# Altium footprint library ALL.PcbLib: 153 footprints (part 3 of 11)
Each footprint in its own frame and in the unit in brackets; x right, y up, seen from the top. Pads: shape width x height; smd on the part's side, far side on the other; paste and mask are expansions set on the pad; w line width, h text height; cw(c..) or ccw(c..) is an arc to the next point about the centre after c.
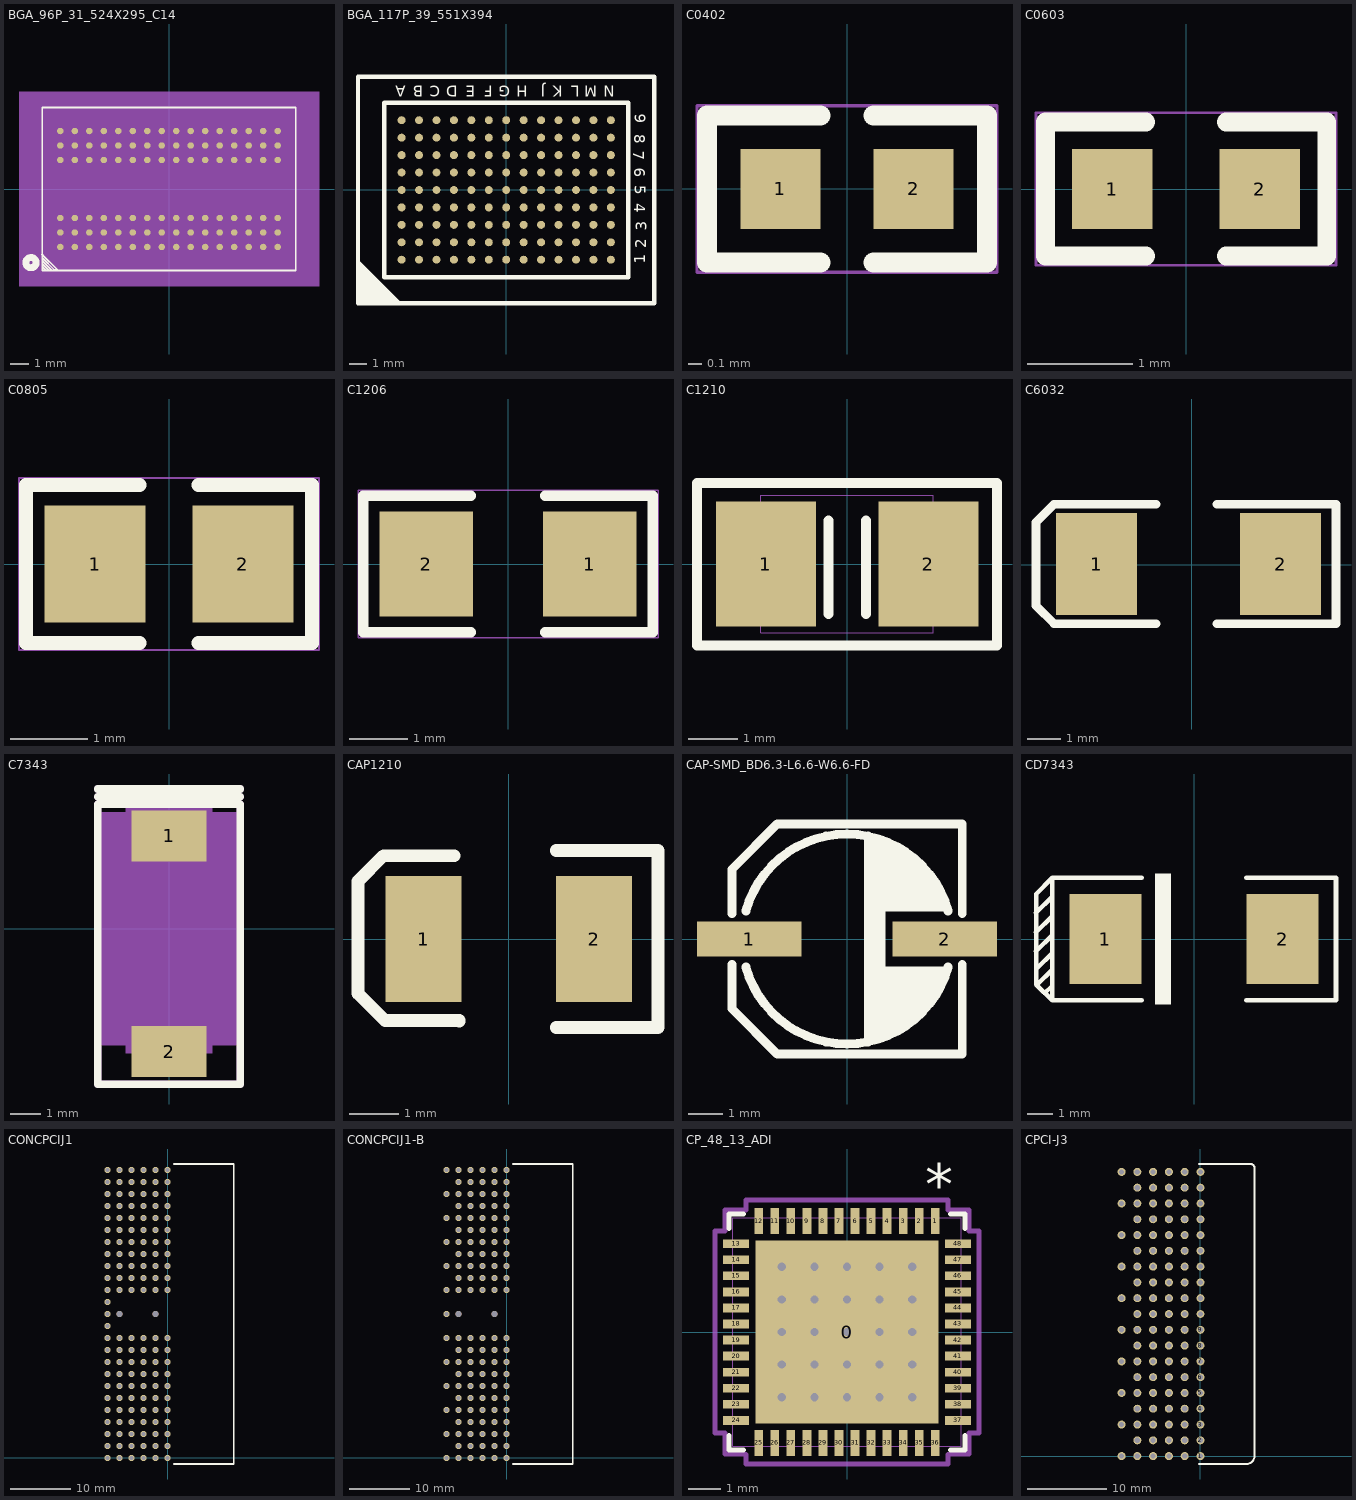
[diagram p2: the footprints below, top view; thin cyan lines are the x and y axes]

## BGA_96P_31_524X295_C14 [mil] "BGA_96P_31_524X295_C14"
pads (96):
  round 14 smd: A1(-236.22,-125.98) A2(-236.22,-94.49) A3(-236.22,-62.99) A7(-236.22,62.99) A8(-236.22,94.49) A9(-236.22,125.98) B1(-204.72,-125.98) B2(-204.72,-94.49) B3(-204.72,-62.99) B7(-204.72,62.99) B8(-204.72,94.49) B9(-204.72,125.98) C1(-173.23,-125.98) C2(-173.23,-94.49) C3(-173.23,-62.99) C7(-173.23,62.99) C8(-173.23,94.49) C9(-173.23,125.98) D1(-141.73,-125.98) D2(-141.73,-94.49) D3(-141.73,-62.99) D7(-141.73,62.99) D8(-141.73,94.49) D9(-141.73,125.98) E1(-110.24,-125.98) E2(-110.24,-94.49) E3(-110.24,-62.99) E7(-110.24,62.99) E8(-110.24,94.49) E9(-110.24,125.98) F1(-78.74,-125.98) F2(-78.74,-94.49) F3(-78.74,-62.99) F7(-78.74,62.99) F8(-78.74,94.49) F9(-78.74,125.98) G1(-47.24,-125.98) G2(-47.24,-94.49) G3(-47.24,-62.99) G7(-47.24,62.99) G8(-47.24,94.49) G9(-47.24,125.98) H1(-15.75,-125.98) H2(-15.75,-94.49) H3(-15.75,-62.99) H7(-15.75,62.99) H8(-15.75,94.49) H9(-15.75,125.98) J1(15.75,-125.98) J2(15.75,-94.49) J3(15.75,-62.99) J7(15.75,62.99) J8(15.75,94.49) J9(15.75,125.98) K1(47.24,-125.98) K2(47.24,-94.49) K3(47.24,-62.99) K7(47.24,62.99) K8(47.24,94.49) K9(47.24,125.98) L1(78.74,-125.98) L2(78.74,-94.49) L3(78.74,-62.99) L7(78.74,62.99) L8(78.74,94.49) L9(78.74,125.98) M1(110.24,-125.98) M2(110.24,-94.49) M3(110.24,-62.99) M7(110.24,62.99) M8(110.24,94.49) M9(110.24,125.98) N1(141.73,-125.98) N2(141.73,-94.49) N3(141.73,-62.99) N7(141.73,62.99) N8(141.73,94.49) N9(141.73,125.98) P1(173.23,-125.98) P2(173.23,-94.49) P3(173.23,-62.99) P7(173.23,62.99) P8(173.23,94.49) P9(173.23,125.98) R1(204.72,-125.98) R2(204.72,-94.49) R3(204.72,-62.99) R7(204.72,62.99) R8(204.72,94.49) R9(204.72,125.98) T1(236.22,-125.98) T2(236.22,-94.49) T3(236.22,-62.99) T7(236.22,62.99) T8(236.22,94.49) T9(236.22,125.98)
Top Overlay:
  circle w15: c-300,-160 r11.18
  lines w3.94: -275.98,-142.52 -275.2,-142.52 -241.73,-175.98 -248.82,-175.98 -275.2,-149.61 -275.2,-156.3 -255.12,-176.38 -261.42,-176.38 -274.41,-163.39 -274.41,-170.08 -268.11,-176.38 ; -275.59,-177.16 275.59,-177.16 275.59,177.16 -275.59,177.16 -275.59,-177.16
Mechanical 5:
  circle w15: c-300,-160 r11.18
  lines w3.94: -275.98,-142.52 -275.2,-142.52 -241.73,-175.98 -248.82,-175.98 -275.2,-149.61 -275.2,-156.3 -255.12,-176.38 -261.42,-176.38 -274.41,-163.39 -274.41,-170.08 -268.11,-176.38 ; -275.59,-177.16 275.59,-177.16 275.59,177.16 -275.59,177.16 -275.59,-177.16
  text "U4" at -362.51,27.5 h25
Mechanical 14:
  text "R1" at 204.72,-105.82 h25.2
  text "R9" at 204.72,146.14 h25.2
  text "F1" at -78.74,-105.82 h25.2
  text "D2" at -141.73,-74.33 h25.2
  text "A1" at -236.22,-105.82 h25.2
  text "B2" at -204.72,-74.33 h25.2
  text "C1" at -173.23,-105.82 h25.2
  text "H2" at -15.75,-74.33 h25.2
  text "K8" at 47.24,114.65 h25.2
  text "E9" at -110.24,146.14 h25.2
  text "D9" at -141.73,146.14 h25.2
  text "C9" at -173.23,146.14 h25.2
  text "A8" at -236.22,114.65 h25.2
  text "G7" at -47.24,83.15 h25.2
  text "H9" at -15.75,146.14 h25.2
  text "K2" at 47.24,-74.33 h25.2
  text "N1" at 141.73,-105.82 h25.2
  text "N9" at 141.73,146.14 h25.2
  text "H1" at -15.75,-105.82 h25.2
  text "M8" at 110.24,114.65 h25.2
  text "D3" at -141.73,-42.83 h25.2
  text "E7" at -110.24,83.15 h25.2
  text "M2" at 110.24,-74.33 h25.2
  text "K9" at 47.24,146.14 h25.2
  text "K3" at 47.24,-42.83 h25.2
  text "J7" at 15.75,83.15 h25.2
  text "K7" at 47.24,83.15 h25.2
  text "J3" at 15.75,-42.83 h25.2
  text "L3" at 78.74,-42.83 h25.2
  text "M3" at 110.24,-42.83 h25.2
  text "L2" at 78.74,-74.33 h25.2
  text "N8" at 141.73,114.65 h25.2
  text "L8" at 78.74,114.65 h25.2
  text "C7" at -173.23,83.15 h25.2
  text "G3" at -47.24,-42.83 h25.2
  text "K1" at 47.24,-105.82 h25.2
  text "T7" at 236.22,83.15 h25.2
  text "R2" at 204.72,-74.33 h25.2
  text "R7" at 204.72,83.15 h25.2
  text "L7" at 78.74,83.15 h25.2
  text "H8" at -15.75,114.65 h25.2
  text "B8" at -204.72,114.65 h25.2
  text "T2" at 236.22,-74.33 h25.2
  text "P3" at 173.23,-42.83 h25.2
  text "C8" at -173.23,114.65 h25.2
  text "F2" at -78.74,-74.33 h25.2
  text "N3" at 141.73,-42.83 h25.2
  text "R8" at 204.72,114.65 h25.2
  text "H7" at -15.75,83.15 h25.2
  text "A2" at -236.22,-74.33 h25.2
  text "G2" at -47.24,-74.33 h25.2
  text "N2" at 141.73,-74.33 h25.2
  text "C2" at -173.23,-74.33 h25.2
  text "T3" at 236.22,-42.83 h25.2
  text "P7" at 173.23,83.15 h25.2
  text "T8" at 236.22,114.65 h25.2
  text "D7" at -141.73,83.15 h25.2
  text "C3" at -173.23,-42.83 h25.2
  text "M7" at 110.24,83.15 h25.2
  text "F7" at -78.74,83.15 h25.2
  text "N7" at 141.73,83.15 h25.2
  text "R3" at 204.72,-42.83 h25.2
  text "F8" at -78.74,114.65 h25.2
  text "A7" at -236.22,83.15 h25.2
  text "A3" at -236.22,-42.83 h25.2
  text "E3" at -110.24,-42.83 h25.2
  text "P2" at 173.23,-74.33 h25.2
  text "H3" at -15.75,-42.83 h25.2
  text "P8" at 173.23,114.65 h25.2
  text "F3" at -78.74,-42.83 h25.2
  text "B7" at -204.72,83.15 h25.2
  text "J1" at 15.75,-105.82 h25.2
  text "J9" at 15.75,146.14 h25.2
  text "L1" at 78.74,-105.82 h25.2
  text "L9" at 78.74,146.14 h25.2
  text "B1" at -204.72,-105.82 h25.2
  text "D1" at -141.73,-105.82 h25.2
  text "E2" at -110.24,-74.33 h25.2
  text "E1" at -110.24,-105.82 h25.2
  text "G1" at -47.24,-105.82 h25.2
  text "D8" at -141.73,114.65 h25.2
  text "E8" at -110.24,114.65 h25.2
  text "F9" at -78.74,146.14 h25.2
  text "G9" at -47.24,146.14 h25.2
  text "G8" at -47.24,114.65 h25.2
  text "B3" at -204.72,-42.83 h25.2
  text "B9" at -204.72,146.14 h25.2
  text "A9" at -236.22,146.14 h25.2
  text "J2" at 15.75,-74.33 h25.2
  text "M1" at 110.24,-105.82 h25.2
  text "P1" at 173.23,-105.82 h25.2
  text "T1" at 236.22,-105.82 h25.2
  text "J8" at 15.75,114.65 h25.2
  text "M9" at 110.24,146.14 h25.2
  text "P9" at 173.23,146.14 h25.2
  text "T9" at 236.22,146.14 h25.2
Mechanical 16:
  region: -285,-185 285,-185 285,185 -285,185
  pour cut-out: -325.98,-211.81 325.98,-211.81 325.98,211.81 -325.98,211.81
3D body: height 150, standoff 0, extent -285,-185 285,185

## BGA_117P_39_551X394 [mil] "BGA_117P_39_551X394"
pads (117):
  round 18 smd: A1(-236.22,-157.48) A2(-236.22,-118.11) A3(-236.22,-78.74) A4(-236.22,-39.37) A5(-236.22,0) A6(-236.22,39.37) A7(-236.22,78.74) A8(-236.22,118.11) A9(-236.22,157.48) B1(-196.85,-157.48) B2(-196.85,-118.11) B3(-196.85,-78.74) B4(-196.85,-39.37) B5(-196.85,0) B6(-196.85,39.37) B7(-196.85,78.74) B8(-196.85,118.11) B9(-196.85,157.48) C1(-157.48,-157.48) C2(-157.48,-118.11) C3(-157.48,-78.74) C4(-157.48,-39.37) C5(-157.48,0) C6(-157.48,39.37) C7(-157.48,78.74) C8(-157.48,118.11) C9(-157.48,157.48) D1(-118.11,-157.48) D2(-118.11,-118.11) D3(-118.11,-78.74) D4(-118.11,-39.37) D5(-118.11,0) D6(-118.11,39.37) D7(-118.11,78.74) D8(-118.11,118.11) D9(-118.11,157.48) E1(-78.74,-157.48) E2(-78.74,-118.11) E3(-78.74,-78.74) E4(-78.74,-39.37) E5(-78.74,0) E6(-78.74,39.37) E7(-78.74,78.74) E8(-78.74,118.11) E9(-78.74,157.48) F1(-39.37,-157.48) F2(-39.37,-118.11) F3(-39.37,-78.74) F4(-39.37,-39.37) F5(-39.37,0) F6(-39.37,39.37) F7(-39.37,78.74) F8(-39.37,118.11) F9(-39.37,157.48) G1(0,-157.48) G2(0,-118.11) G3(0,-78.74) G4(0,-39.37) G5(0,0) G6(0,39.37) G7(0,78.74) G8(0,118.11) G9(0,157.48) H1(39.37,-157.48) H2(39.37,-118.11) H3(39.37,-78.74) H4(39.37,-39.37) H5(39.37,0) H6(39.37,39.37) H7(39.37,78.74) H8(39.37,118.11) H9(39.37,157.48) J1(78.74,-157.48) J2(78.74,-118.11) J3(78.74,-78.74) J4(78.74,-39.37) J5(78.74,0) J6(78.74,39.37) J7(78.74,78.74) J8(78.74,118.11) J9(78.74,157.48) K1(118.11,-157.48) K2(118.11,-118.11) K3(118.11,-78.74) K4(118.11,-39.37) K5(118.11,0) K6(118.11,39.37) K7(118.11,78.74) K8(118.11,118.11) K9(118.11,157.48) L1(157.48,-157.48) L2(157.48,-118.11) L3(157.48,-78.74) L4(157.48,-39.37) L5(157.48,0) L6(157.48,39.37) L7(157.48,78.74) L8(157.48,118.11) L9(157.48,157.48) M1(196.85,-157.48) M2(196.85,-118.11) M3(196.85,-78.74) M4(196.85,-39.37) M5(196.85,0) M6(196.85,39.37) M7(196.85,78.74) M8(196.85,118.11) M9(196.85,157.48) N1(236.22,-157.48) N2(236.22,-118.11) N3(236.22,-78.74) N4(236.22,-39.37) N5(236.22,0) N6(236.22,39.37) N7(236.22,78.74) N8(236.22,118.11) N9(236.22,157.48)
Top Overlay:
  dashed: -334.65,-157.48 -236.22,-255.91 -334.65,-255.91
  lines w10: -334.65,-255.91 334.65,-255.91 334.65,255.91 -334.65,255.91 -334.65,-255.91 ; -275.59,-196.85 275.59,-196.85 275.59,196.85 -275.59,196.85 -275.59,-196.85
  text "1" at 313.65,-166.91 h25
  text "2" at 315.65,-131.91 h25
  text "3" at 317.65,-91.91 h25
  text "4" at 288.65,-29.91 h25
  text "5" at 289.65,10.09 h25
  text "6" at 288.65,50.09 h25
  text "N" at 245.22,235.28 h25
  text "7" at 286.65,88.09 h25
  text "8" at 288.65,126.09 h25
  text "9" at 289.65,172.09 h25
  text "J" at 87.74,235.28 h25
  text "K" at 127.11,235.28 h25
  text "L" at 166.48,235.28 h25
  text "M" at 205.85,235.28 h25
  text "E" at -69.74,235.28 h25
  text "F" at -30.37,235.28 h25
  text "G" at 9,235.28 h25
  text "H" at 48.37,235.28 h25
  text ".Designator" at 6,312.5 h30
  text "A" at -227.22,235.28 h25
  text "B" at -187.85,235.28 h25
  text "C" at -148.48,235.28 h25
  text "D" at -109.11,235.28 h25
Bottom Overlay:
  text "88E1111-B2-BAB2I000" at 250.5,-429.5 h60
Mechanical 7:
  lines w1: -334.65,-255.91 334.65,-255.91 334.65,255.91 -334.65,255.91 -334.65,-255.91
Mechanical 13:
  text "N8" at 258.62,-118.11 h28
  text "N9" at 258.62,-157.48 h28
  text "M9" at 219.25,-157.48 h28
  text "M8" at 219.25,-118.11 h28
  text "N4" at 258.62,39.37 h28
  text "N7" at 258.62,-78.74 h28
  text "N6" at 258.62,-39.37 h28
  text "N5" at 258.62,0 h28
  text "M4" at 219.25,39.37 h28
  text "M7" at 219.25,-78.74 h28
  text "M6" at 219.25,-39.37 h28
  text "M5" at 219.25,0 h28
  text "N3" at 258.62,78.74 h28
  text "N1" at 258.62,157.48 h28
  text "N2" at 258.62,118.11 h28
  text "M3" at 219.25,78.74 h28
  text "M2" at 219.25,118.11 h28
  text "M1" at 219.25,157.48 h28
  text "K9" at 140.51,-157.48 h28
  text "J8" at 101.14,-118.11 h28
  text "K8" at 140.51,-118.11 h28
  text "H8" at 61.77,-118.11 h28
  text "L9" at 179.88,-157.48 h28
  text "L8" at 179.88,-118.11 h28
  text "H9" at 61.77,-157.48 h28
  text "J9" at 101.14,-157.48 h28
  text "K4" at 140.51,39.37 h28
  text "K5" at 140.51,0 h28
  text "L6" at 179.88,-39.37 h28
  text "K6" at 140.51,-39.37 h28
  text "L5" at 179.88,0 h28
  text "L4" at 179.88,39.37 h28
  text "J5" at 101.14,0 h28
  text "J4" at 101.14,39.37 h28
  text "H4" at 61.77,39.37 h28
  text "H5" at 61.77,0 h28
  text "J6" at 101.14,-39.37 h28
  text "H6" at 61.77,-39.37 h28
  text "H7" at 61.77,-78.74 h28
  text "L7" at 179.88,-78.74 h28
  text "J7" at 101.14,-78.74 h28
  text "K7" at 140.51,-78.74 h28
  text "K1" at 140.51,157.48 h28
  text "L2" at 179.88,118.11 h28
  text "H3" at 61.77,78.74 h28
  text "K2" at 140.51,118.11 h28
  text "H1" at 61.77,157.48 h28
  text "J1" at 101.14,157.48 h28
  text "L1" at 179.88,157.48 h28
  text "H2" at 61.77,118.11 h28
  text "J2" at 101.14,118.11 h28
  text "J3" at 101.14,78.74 h28
  text "K3" at 140.51,78.74 h28
  text "L3" at 179.88,78.74 h28
  text "G8" at 22.4,-118.11 h28
  text "G9" at 22.4,-157.48 h28
  text "E8" at -56.34,-118.11 h28
  text "D8" at -95.71,-118.11 h28
  text "E9" at -56.34,-157.48 h28
  text "F8" at -16.97,-118.11 h28
  text "F9" at -16.97,-157.48 h28
  text "D9" at -95.71,-157.48 h28
  text "D5" at -95.71,0 h28
  text "E6" at -56.34,-39.37 h28
  text "F6" at -16.97,-39.37 h28
  text "G4" at 22.4,39.37 h28
  text "F5" at -16.97,0 h28
  text "F4" at -16.97,39.37 h28
  text "E4" at -56.34,39.37 h28
  text "E5" at -56.34,0 h28
  text "D6" at -95.71,-39.37 h28
  text "G5" at 22.4,0 h28
  text "D4" at -95.71,39.37 h28
  text "G6" at 22.4,-39.37 h28
  text "F7" at -16.97,-78.74 h28
  text "G7" at 22.4,-78.74 h28
  text "D7" at -95.71,-78.74 h28
  text "E7" at -56.34,-78.74 h28
  text "E2" at -56.34,118.11 h28
  text "F2" at -16.97,118.11 h28
  text "G3" at 22.4,78.74 h28
  text "F1" at -16.97,157.48 h28
  text "E3" at -56.34,78.74 h28
  text "F3" at -16.97,78.74 h28
  text "G2" at 22.4,118.11 h28
  text "D1" at -95.71,157.48 h28
  text "E1" at -56.34,157.48 h28
  text "D2" at -95.71,118.11 h28
  text "D3" at -95.71,78.74 h28
  text "G1" at 22.4,157.48 h28
  text "A8" at -213.82,-118.11 h28
  text "B9" at -174.45,-157.48 h28
  text "B8" at -174.45,-118.11 h28
  text "A9" at -213.82,-157.48 h28
  text "C8" at -135.08,-118.11 h28
  text "C9" at -135.08,-157.48 h28
  text "A7" at -213.82,-78.74 h28
  text "B4" at -174.45,39.37 h28
  text "B6" at -174.45,-39.37 h28
  text "A4" at -213.82,39.37 h28
  text "A6" at -213.82,-39.37 h28
  text "C6" at -135.08,-39.37 h28
  text "C7" at -135.08,-78.74 h28
  text "B7" at -174.45,-78.74 h28
  text "A5" at -213.82,0 h28
  text "C5" at -135.08,0 h28
  text "C4" at -135.08,39.37 h28
  text "B5" at -174.45,0 h28
  text "C2" at -135.08,118.11 h28
  text "A3" at -213.82,78.74 h28
  text "B1" at -174.45,157.48 h28
  text "C1" at -135.08,157.48 h28
  text "A2" at -213.82,118.11 h28
  text "A1" at -213.82,157.48 h28
  text "B3" at -174.45,78.74 h28
  text "C3" at -135.08,78.74 h28
  text "B2" at -174.45,118.11 h28
Mechanical 14:
  text "N" at 246.22,232.28 h25
  text "M" at 206.85,232.28 h25
  text "L" at 167.48,232.28 h25
  text "K" at 128.11,232.28 h25
  text "J" at 88.74,232.28 h25
  text "H" at 49.37,232.28 h25
  text "G" at 10,232.28 h25
  text "F" at -29.37,232.28 h25
  text "E" at -68.74,232.28 h25
  text "D" at -108.11,232.28 h25
  text "U63" at 19.84,277.25 h25
  text "C" at -147.48,232.28 h25
  text "B" at -186.85,232.28 h25
  text "A" at -226.22,232.28 h25
  text "9" at -297.09,-149.61 h25
  text "8" at -297.09,-110.24 h25
  text "7" at -297.09,-70.87 h25
  text "6" at -297.09,-31.5 h25
  text "5" at -297.09,7.87 h25
  text "4" at -297.09,47.24 h25
  text "3" at -297.09,86.61 h25
  text "2" at -297.09,125.98 h25
  text "1" at -297.09,165.35 h25
Mechanical 15:
  text ".Designator" at 43.2,-12 h36
Mechanical 16:
  lines w1: -275.59,-196.85 275.59,-196.85 275.59,196.85 -275.59,196.85 -275.59,-196.85

## C0402 [mm] "C0402"
pads (2):
  rect 0.6x0.6 smd: 1(-0.5,0) 2(0.5,0)
Top Overlay:
  lines w0.15: -0.2,-0.55 -1.05,-0.55 -1.05,0.55 -0.2,0.55 ; 0.2,-0.55 1.05,-0.55 1.05,0.55 0.2,0.55
  text ".Designator" at 3.353,0.33 h0.76
Mechanical 7:
  lines w0.025: -1.125,-0.625 1.125,-0.625 1.125,0.625 -1.125,0.625 -1.125,-0.625

## C0603 [mil] "C0603"
pads (2):
  rect 30x30 smd: 1(-27.5,0) 2(27.5,0)
Top Overlay:
  lines w7: -15,-25 -52.5,-25 -52.5,25 -15,25 ; 15,-25 52.5,-25 52.5,25 15,25
Mechanical 7:
  lines w1: -56,-28.5 -56,28.5 56,28.5 56,-28.5 -56,-28.5
Mechanical 16:
  text ".Designator" at 0,0 h30

## C0805 [mm] "C0805"
pads (2):
  rect 1.3x1.5 smd: 1(-0.95,0) 2(0.95,0)
Top Overlay:
  lines w0.178: -0.381,-1.019 -1.841,-1.019 -1.841,1.019 -0.381,1.019 ; 0.381,-1.019 1.841,-1.019 1.841,1.019 0.381,1.019
Mechanical 7:
  lines w0.025: -1.93,-1.107 -1.93,1.107 1.93,1.107 1.93,-1.107 -1.93,-1.107
Mechanical 16:
  text ".Designator" at 0,0 h0.76

## C1206 [mm] "C1206"
pads (2):
  rect 1.6x1.8 smd: 1(1.4,0) 2(-1.4,0)
Top Overlay:
  lines w0.178: -0.635,-1.168 -2.476,-1.168 -2.476,1.168 -0.635,1.168 ; 0.635,-1.168 2.476,-1.168 2.476,1.168 0.635,1.168
  text ".Designator" at -1.092,2.476 h0.76
Mechanical 7:
  lines w0.025: -2.565,-1.257 2.565,-1.257 2.565,1.257 -2.565,1.257 -2.565,-1.257

## C1210 [mil] "C1210"
pads (2):
  rect 80x100 smd: 1(-65,0) 2(65,0)
Top Overlay:
  lines w8: -15,-40 -15,35 ; 15,-40 15,35 ; -120,-65 -120,65 120,65 120,-65 -120,-65
  text ".Designator" at 2,-131.5 h30
Mechanical 7:
  lines w1: -69,-55 -69,55 69,55 69,-55 -69,-55

## C6032 [mil]
height 98.43
pads (2):
  rect 95x120 smd: 1(-112,1) 2(104,1)
Top Overlay:
  lines w10: -42,-69 -156,-69 -162,-69 -183,-48 -183,50 -163,70 -162,71 -42,71 ; 29,-69 169,-69 169,71 29,71
3D body "TAJ-C.STEP": height 102.36, standoff 0, extent -121.11,-61.99 115.11,63.99

## C7343 [mil] "C7343"
pads (2):
  rect 98x67 smd: 1(0,121.98) 2(0,-161.35)
Top Overlay:
  lines w9.84: -93.58,-163.48 -93.58,-204.06 93.58,-204.06 93.58,-163.48
  lines w10: -93.58,-163.48 -93.58,163.48 ; -93.58,173.48 93.58,173.48 ; -93.58,183.48 93.58,183.48 ; 93.58,-163.48 93.58,163.48 ; -93.58,163.48 93.58,163.48 ; -93.58,163.48 93.58,163.48
Mechanical 5:
  lines w9.84: -93.58,-163.48 -93.58,-204.06 93.58,-204.06 93.58,-163.48
  lines w10: -93.58,-163.48 -93.58,163.48 ; -93.58,173.48 93.58,173.48 ; -93.58,183.48 93.58,183.48 ; 93.58,-163.48 93.58,163.48 ; -93.58,163.48 93.58,163.48 ; -93.58,163.48 93.58,163.48
  text "CT1" at -30,209.48 h25
Mechanical 14:
  text "2" at -10,-161.35 h25
  text "1" at -10,121.98 h25
Mechanical 16:
  region: -88.58,147.64 -88.58,-147.64 88.58,-147.64 88.58,147.64
  pour cut-out: 57,163.48 57,152.64 93.58,152.64 93.58,-152.64 57,-152.64 57,-163.48 -57,-163.48 -57,-152.64 -93.58,-152.64 -93.58,152.64 -57,152.64 -57,163.48
  lines w1: -88.58,-147.64 88.58,-147.64 88.58,147.64 -88.58,147.64 -88.58,-147.64
Mechanical 17:
  text ".Designator" at -30,-16.67 h25
3D body: height 150, standoff 0, extent -88.58,-147.64 88.58,147.64

## CAP1210 [mil]
pads (2):
  rect 60x100 smd: 1(-67.5,0) 2(67.5,0)
Top Overlay:
  lines w10: -43.21,65.95 -99.06,65.95 -119.34,45.67 -119.34,-43.09 -97.9,-64.53 -39.23,-64.53 -39.23,-65.03 ; 37.5,-70 118,-70 118,70 37.5,70

## CAP-SMD_BD6.3-L6.6-W6.6-FD [mm]
pads (2):
  rect 3x1 smd: 1(-2.8,0) 2(2.8,0)
Top Overlay:
  region: 0.5,-3 0.5,2.9 0.5,3 0.5,2.9 1.1,2.8 1.6,2.6 1.9,2.3 2.2,2.1 2.5,1.8 2.7,1.4 2.9,0.8 1.1,0.8 1.1,-0.8 2.9,-0.8 2.8,-1 2.7,-1.4 2.4,-1.7 2.2,-2.1 1.8,-2.4 1.4,-2.6 1,-2.8
  lines w0.254: -3.297,-0.732 -3.297,-1.999 -1.996,-3.299 3.302,-3.299 3.302,-0.732 ; -3.297,0.732 -3.297,1.999 -1.996,3.299 3.302,3.299 3.302,0.732 ; -2.9,-0.8 ccw(c0,0) 2.9,-0.8 ; -2.9,0.8 cw(c0,0) 2.9,0.8

## CD7343 [mm]
pads (2):
  rect 2.8x3.5 smd: 1(-3.45,0) 2(3.45,0)
Top Overlay:
  rectangle: -1.524,-2.54 -0.889,2.54
  lines w0.178: -6.151,-0.474 -5.524,0.152 ; -6.151,0.263 -5.524,0.889 ; -6.151,1.025 -5.524,1.651 ; -6.092,-1.761 -5.524,-1.194 ; -6.092,-1.126 -5.524,-0.559 ; -5.817,-2.108 -5.524,-1.829 ; -2.032,-2.388 -5.524,-2.388 ; -2.032,2.388 -5.524,2.388 ; 2.032,-2.388 5.524,-2.388 5.524,2.388 2.032,2.388 ; -5.524,-2.388 -5.524,2.388 ; -5.524,-2.388 -6.147,-1.778 -6.147,1.753 -5.524,2.388

## CONCPCIJ1 [mil]
pads (150):
  round 40 hole 26: A1(0,0) A2(0,78.74) A3(0,157.48) A4(0,236.22) A5(0,314.96) A6(0,393.7) A7(0,472.44) A8(0,551.18) A9(0,629.92) A10(0,708.66) A11(0,787.4) A15(0,1102.36) A16(0,1181.1) A17(0,1259.84) A18(0,1338.58) A19(0,1417.32) A20(0,1496.06) A21(0,1574.8) A22(0,1653.54) A23(0,1732.28) A24(0,1811.02) A25(0,1889.76) B1(-78.74,0) B2(-78.74,78.74) B3(-78.74,157.48) B4(-78.74,236.22) B5(-78.74,314.96) B6(-78.74,393.7) B7(-78.74,472.44) B8(-78.74,551.18) B9(-78.74,629.92) B10(-78.74,708.66) B11(-78.74,787.4) B15(-78.74,1102.36) B16(-78.74,1181.1) B17(-78.74,1259.84) B18(-78.74,1338.58) B19(-78.74,1417.32) B20(-78.74,1496.06) B21(-78.74,1574.8) B22(-78.74,1653.54) B23(-78.74,1732.28) B24(-78.74,1811.02) B25(-78.74,1889.76) C1(-157.48,0) C2(-157.48,78.74) C3(-157.48,157.48) C4(-157.48,236.22) C5(-157.48,314.96) C6(-157.48,393.7) C7(-157.48,472.44) C8(-157.48,551.18) C9(-157.48,629.92) C10(-157.48,708.66) C11(-157.48,787.4) C15(-157.48,1102.36) C16(-157.48,1181.1) C17(-157.48,1259.84) C18(-157.48,1338.58) C19(-157.48,1417.32) C20(-157.48,1496.06) C21(-157.48,1574.8) C22(-157.48,1653.54) C23(-157.48,1732.28) C24(-157.48,1811.02) C25(-157.48,1889.76) D1(-236.22,0) D2(-236.22,78.74) D3(-236.22,157.48) D4(-236.22,236.22) D5(-236.22,314.96) D6(-236.22,393.7) D7(-236.22,472.44) D8(-236.22,551.18) D9(-236.22,629.92) D10(-236.22,708.66) D11(-236.22,787.4) D15(-236.22,1102.36) D16(-236.22,1181.1) D17(-236.22,1259.84) D18(-236.22,1338.58) D19(-236.22,1417.32) D20(-236.22,1496.06) D21(-236.22,1574.8) D22(-236.22,1653.54) D23(-236.22,1732.28) D24(-236.22,1811.02) D25(-236.22,1889.76) E1(-314.96,0) E2(-314.96,78.74) E3(-314.96,157.48) E4(-314.96,236.22) E5(-314.96,314.96) E6(-314.96,393.7) E7(-314.96,472.44) E8(-314.96,551.18) E9(-314.96,629.92) E10(-314.96,708.66) E11(-314.96,787.4) E15(-314.96,1102.36) E16(-314.96,1181.1) E17(-314.96,1259.84) E18(-314.96,1338.58) E19(-314.96,1417.32) E20(-314.96,1496.06) E21(-314.96,1574.8) E22(-314.96,1653.54) E23(-314.96,1732.28) E24(-314.96,1811.02) E25(-314.96,1889.76) F1(-393.7,0) F2(-393.7,78.74) F3(-393.7,157.48) F4(-393.7,236.22) F5(-393.7,314.96) F6(-393.7,393.7) F7(-393.7,472.44) F8(-393.7,551.18) F9(-393.7,629.92) F10(-393.7,708.66) F11(-393.7,787.4) F12(-393.7,866.14) F13(-393.7,944.88) F14(-393.7,1023.62) F15(-393.7,1102.36) F16(-393.7,1181.1) F17(-393.7,1259.84) F18(-393.7,1338.58) F19(-393.7,1417.32) F20(-393.7,1496.06) F21(-393.7,1574.8) F22(-393.7,1653.54) F23(-393.7,1732.28) F24(-393.7,1811.02) F25(-393.7,1889.76)
  round 0 all layers, no hole: A12(0,866.14) A13(0,944.88) A14(0,1023.62) B12(-78.74,866.14) B14(-78.74,1023.62) C12(-157.48,866.14) C13(-157.48,944.88) C14(-157.48,1023.62) D12(-236.22,866.14) D13(-236.22,944.88) D14(-236.22,1023.62) E12(-314.96,866.14) E14(-314.96,1023.62)
  round 40 / inner round 45 / far side round 40 hole 40: B13(-78.74,944.88) E13(-314.96,944.88)
Top Overlay:
  lines w10: 39.37,-39.37 433.07,-39.37 433.07,1929.13 39.37,1929.13

## CONCPCIJ1-B [mil]
pads (138):
  round 40 hole 26: 1(0,0) 2(0,78.74) 3(0,157.48) 4(0,236.22) 5(0,314.96) 6(0,393.7) 7(0,472.44) 8(0,551.18) 9(0,629.92) 10(0,708.66) 11(0,787.4) 15(0,1102.36) 16(0,1181.1) 17(0,1259.84) 18(0,1338.58) 19(0,1417.32) 20(0,1496.06) 21(0,1574.8) 22(0,1653.54) 23(0,1732.28) 24(0,1811.02) 25(0,1889.76) 26(-78.74,0) 27(-78.74,78.74) 28(-78.74,157.48) 29(-78.74,236.22) 30(-78.74,314.96) 31(-78.74,393.7) 32(-78.74,472.44) 33(-78.74,551.18) 34(-78.74,629.92) 35(-78.74,708.66) 36(-78.74,787.4) 40(-78.74,1102.36) 41(-78.74,1181.1) 42(-78.74,1259.84) 43(-78.74,1338.58) 44(-78.74,1417.32) 45(-78.74,1496.06) 46(-78.74,1574.8) 47(-78.74,1653.54) 48(-78.74,1732.28) 49(-78.74,1811.02) 50(-78.74,1889.76) 51(-157.48,0) 52(-157.48,78.74) 53(-157.48,157.48) 54(-157.48,236.22) 55(-157.48,314.96) 56(-157.48,393.7) 57(-157.48,472.44) 58(-157.48,551.18) 59(-157.48,629.92) 60(-157.48,708.66) 61(-157.48,787.4) 65(-157.48,1102.36) 66(-157.48,1181.1) 67(-157.48,1259.84) 68(-157.48,1338.58) 69(-157.48,1417.32) 70(-157.48,1496.06) 71(-157.48,1574.8) 72(-157.48,1653.54) 73(-157.48,1732.28) 74(-157.48,1811.02) 75(-157.48,1889.76) 76(-236.22,0) 77(-236.22,78.74) 78(-236.22,157.48) 79(-236.22,236.22) 80(-236.22,314.96) 81(-236.22,393.7) 82(-236.22,472.44) 83(-236.22,551.18) 84(-236.22,629.92) 85(-236.22,708.66) 86(-236.22,787.4) 90(-236.22,1102.36) 91(-236.22,1181.1) 92(-236.22,1259.84) 93(-236.22,1338.58) 94(-236.22,1417.32) 95(-236.22,1496.06) 96(-236.22,1574.8) 97(-236.22,1653.54) 98(-236.22,1732.28) 99(-236.22,1811.02) 100(-236.22,1889.76) 101(-314.96,0) 102(-314.96,78.74) 103(-314.96,157.48) 104(-314.96,236.22) 105(-314.96,314.96) 106(-314.96,393.7) 107(-314.96,472.44) 108(-314.96,551.18) 109(-314.96,629.92) 110(-314.96,708.66) 111(-314.96,787.4) 115(-314.96,1102.36) 116(-314.96,1181.1) 117(-314.96,1259.84) 118(-314.96,1338.58) 119(-314.96,1417.32) 120(-314.96,1496.06) 121(-314.96,1574.8) 122(-314.96,1653.54) 123(-314.96,1732.28) 124(-314.96,1811.02) 125(-314.96,1889.76) 126(-393.7,0) 127(-393.7,157.48) 128(-393.7,314.96) 129(-393.7,472.44) 130(-393.7,629.92) 131(-393.7,787.4) 132(-393.7,944.88) 133(-393.7,1102.36) 134(-393.7,1259.84) 135(-393.7,1417.32) 136(-393.7,1574.8) 137(-393.7,1732.28) 138(-393.7,1889.76)
  round 0 all layers, no hole: 12(0,866.14) 13(0,944.88) 14(0,1023.62) 37(-78.74,866.14) 39(-78.74,1023.62) 62(-157.48,866.14) 63(-157.48,944.88) 64(-157.48,1023.62) 87(-236.22,866.14) 88(-236.22,944.88) 89(-236.22,1023.62) 112(-314.96,866.14) 114(-314.96,1023.62)
  round 40 / inner round 45 / far side round 40 hole 40: 38(-78.74,944.88) 113(-314.96,944.88)
Top Overlay:
  lines w10: 39.37,-39.37 433.07,-39.37 433.07,1929.13 39.37,1929.13

## CP_48_13_ADI [mm]
pads (49):
  rect 5.7x5.7 smd paste+0 mask+0: 0(0,0)
  rect 0.275x0.805 smd paste+0 mask+0: 1(2.75,3.452) 2(2.25,3.452) 3(1.75,3.452) 4(1.25,3.452) 5(0.75,3.452) 6(0.25,3.452) 7(-0.25,3.452) 8(-0.75,3.452) 9(-1.25,3.452) 10(-1.75,3.452) 11(-2.25,3.452) 12(-2.75,3.452) 25(-2.75,-3.452) 26(-2.25,-3.452) 27(-1.75,-3.452) 28(-1.25,-3.452) 29(-0.75,-3.452) 30(-0.25,-3.452) 31(0.25,-3.452) 32(0.75,-3.452) 33(1.25,-3.452) 34(1.75,-3.452) 35(2.25,-3.452) 36(2.75,-3.452)
  rect 0.805x0.275 smd paste+0 mask+0: 13(-3.452,2.75) 14(-3.452,2.25) 15(-3.452,1.75) 16(-3.452,1.25) 17(-3.452,0.75) 18(-3.452,0.25) 19(-3.452,-0.25) 20(-3.452,-0.75) 21(-3.452,-1.25) 22(-3.452,-1.75) 23(-3.452,-2.25) 24(-3.452,-2.75) 37(3.452,-2.75) 38(3.452,-2.25) 39(3.452,-1.75) 40(3.452,-1.25) 41(3.452,-0.75) 42(3.452,-0.25) 43(3.452,0.25) 44(3.452,0.75) 45(3.452,1.25) 46(3.452,1.75) 47(3.452,2.25) 48(3.452,2.75)
via -2.032,2.032 diameter 0.457 hole 0.254
via -2.032,-2.032 diameter 0.457 hole 0.254
via -2.032,-1.016 diameter 0.457 hole 0.254
via -2.032,1.016 diameter 0.457 hole 0.254
via -1.016,2.032 diameter 0.457 hole 0.254
via -1.016,-2.032 diameter 0.457 hole 0.254
via -1.016,-1.016 diameter 0.457 hole 0.254
via -1.016,1.016 diameter 0.457 hole 0.254
via 2.032,2.032 diameter 0.457 hole 0.254
via 2.032,-2.032 diameter 0.457 hole 0.254
via 2.032,-1.016 diameter 0.457 hole 0.254
via 2.032,1.016 diameter 0.457 hole 0.254
via 1.016,2.032 diameter 0.457 hole 0.254
via 1.016,-2.032 diameter 0.457 hole 0.254
via 1.016,-1.016 diameter 0.457 hole 0.254
via 1.016,1.016 diameter 0.457 hole 0.254
via -2.032,0 diameter 0.457 hole 0.254
via 2.032,0 diameter 0.457 hole 0.254
via 1.016,0 diameter 0.457 hole 0.254
via -1.016,0 diameter 0.457 hole 0.254
via 0,2.032 diameter 0.457 hole 0.254
via 0,-2.032 diameter 0.457 hole 0.254
via 0,-1.016 diameter 0.457 hole 0.254
via 0,1.016 diameter 0.457 hole 0.254
via 0,0 diameter 0.457 hole 0.254
Top Overlay:
  lines w0.152: -3.677,-3.22 -3.677,-3.677 -3.22,-3.677 ; -3.677,3.22 -3.677,3.677 -3.22,3.677 ; 3.22,-3.677 3.677,-3.677 3.677,-3.22 ; 3.22,3.677 3.677,3.677 3.677,3.22
  text "*" at 2.432,3.96 h1.27
Top Paste:
  region: 2.75,2.75 1.525,2.75 1.525,1.525 2.75,1.525
  region: 2.75,1.325 1.525,1.325 1.525,0.1 2.75,0.1
  region: 1.325,2.75 0.1,2.75 0.1,1.525 1.325,1.525
  region: 1.325,1.325 0.1,1.325 0.1,0.1 1.325,0.1
  region: 2.75,-0.1 1.525,-0.1 1.525,-1.325 2.75,-1.325
  region: 1.325,-0.1 0.1,-0.1 0.1,-1.325 1.325,-1.325
  region: 1.325,-1.525 0.1,-1.525 0.1,-2.75 1.325,-2.75
  region: 2.75,-1.525 1.525,-1.525 1.525,-2.75 2.75,-2.75
  region: -1.525,2.75 -2.75,2.75 -2.75,1.525 -1.525,1.525
  region: -0.1,2.75 -1.325,2.75 -1.325,1.525 -0.1,1.525
  region: -1.525,1.325 -2.75,1.325 -2.75,0.1 -1.525,0.1
  region: -0.1,1.325 -1.325,1.325 -1.325,0.1 -0.1,0.1
  region: -1.525,-0.1 -2.75,-0.1 -2.75,-1.325 -1.525,-1.325
  region: -0.1,-0.1 -1.325,-0.1 -1.325,-1.325 -0.1,-1.325
  region: -0.1,-1.525 -1.325,-1.525 -1.325,-2.75 -0.1,-2.75
  region: -1.525,-1.525 -2.75,-1.525 -2.75,-2.75 -1.525,-2.75
Mechanical 13:
  lines w0.025: -3.55,-3.55 3.55,-3.55 3.55,3.55 -3.55,3.55 -3.55,-3.55 ; -3.55,-2.9 -3.55,-2.6 -3.55,-2.9 ; -3.55,-2.4 -3.55,-2.1 -3.55,-2.4 ; -3.55,-1.9 -3.55,-1.6 -3.55,-1.9 ; -3.55,-1.4 -3.55,-1.1 -3.55,-1.4 ; -3.55,-0.9 -3.55,-0.6 -3.55,-0.9 ; -3.55,-0.4 -3.55,-0.1 -3.55,-0.4 ; -3.55,0.1 -3.55,0.4 -3.55,0.1 ; -3.55,0.6 -3.55,0.9 -3.55,0.6 ; -3.55,1.1 -3.55,1.4 -3.55,1.1 ; -3.55,1.6 -3.55,1.9 -3.55,1.6 ; -3.55,2.1 -3.55,2.4 -3.55,2.1 ; -3.55,2.6 -3.55,2.9 -3.55,2.6 ; -2.9,-3.55 -2.6,-3.55 -2.9,-3.55 ; -2.9,3.55 -2.6,3.55 -2.9,3.55 ; -2.4,-3.55 -2.1,-3.55 -2.4,-3.55 ; -2.4,3.55 -2.1,3.55 -2.4,3.55 ; -1.9,-3.55 -1.6,-3.55 -1.9,-3.55 ; -1.9,3.55 -1.6,3.55 -1.9,3.55 ; -1.4,-3.55 -1.1,-3.55 -1.4,-3.55 ; -1.4,3.55 -1.1,3.55 -1.4,3.55 ; -0.9,-3.55 -0.6,-3.55 -0.9,-3.55 ; -0.9,3.55 -0.6,3.55 -0.9,3.55 ; -0.4,-3.55 -0.1,-3.55 -0.4,-3.55 ; -0.4,3.55 -0.1,3.55 -0.4,3.55 ; 0.1,-3.55 0.4,-3.55 0.1,-3.55 ; 0.1,3.55 0.4,3.55 0.1,3.55 ; 0.6,-3.55 0.9,-3.55 0.6,-3.55 ; 0.6,3.55 0.9,3.55 0.6,3.55 ; 1.1,-3.55 1.4,-3.55 1.1,-3.55 ; 1.1,3.55 1.4,3.55 1.1,3.55 ; 1.6,-3.55 1.9,-3.55 1.6,-3.55 ; 1.6,3.55 1.9,3.55 1.6,3.55 ; 2.1,-3.55 2.4,-3.55 2.1,-3.55 ; 2.1,3.55 2.4,3.55 2.1,3.55 ; 2.6,-3.55 2.9,-3.55 2.6,-3.55 ; 2.6,3.55 2.9,3.55 2.6,3.55 ; 3.55,-2.9 3.55,-2.6 3.55,-2.9 ; 3.55,-2.4 3.55,-2.1 3.55,-2.4 ; 3.55,-1.9 3.55,-1.6 3.55,-1.9 ; 3.55,-1.4 3.55,-1.1 3.55,-1.4 ; 3.55,-0.9 3.55,-0.6 3.55,-0.9 ; 3.55,-0.4 3.55,-0.1 3.55,-0.4 ; 3.55,0.1 3.55,0.4 3.55,0.1 ; 3.55,0.6 3.55,0.9 3.55,0.6 ; 3.55,1.1 3.55,1.4 3.55,1.1 ; 3.55,1.6 3.55,1.9 3.55,1.6 ; 3.55,2.1 3.55,2.4 3.55,2.1 ; 3.55,2.6 3.55,2.9 3.55,2.6
  text "*" at 2.591,2.983 h0.64
Mechanical 15:
  lines w0.152: -4.109,-3.141 -3.804,-3.141 -3.804,-3.804 -3.141,-3.804 -3.141,-4.109 3.141,-4.109 3.141,-3.804 3.804,-3.804 3.804,-3.141 4.109,-3.141 4.109,3.141 3.804,3.141 3.804,3.804 3.141,3.804 3.141,4.109 -3.141,4.109 -3.141,3.804 -3.804,3.804 -3.804,3.141 -4.109,3.141 -4.109,-3.141
3D body "CP_48_13_ADI.step": height 0.8, standoff 0, extent -3.55,-3.55 3.55,3.55

## CPCI-J3 [mil]
pads (105):
  round 40 / inner round 45 / far side round 40 hole 26: 1(0,0) 2(0,78.74) 3(0,157.48) 4(0,236.22) 5(0,314.96) 6(0,393.7) 7(0,472.44) 8(0,551.18) 9(0,629.92) 10(0,708.66) 11(0,787.4) 12(0,866.14) 13(0,944.88) 14(0,1023.62) 15(0,1102.36) 16(0,1181.1) 17(0,1259.84) 18(0,1338.58) 19(0,1417.32) 20(-78.74,0) 21(-78.74,78.74) 22(-78.74,157.48) 23(-78.74,236.22) 24(-78.74,314.96) 25(-78.74,393.7) 26(-78.74,472.44) 27(-78.74,551.18) 28(-78.74,629.92) 29(-78.74,708.66) 30(-78.74,787.4) 31(-78.74,866.14) 32(-78.74,944.88) 33(-78.74,1023.62) 34(-78.74,1102.36) 35(-78.74,1181.1) 36(-78.74,1259.84) 37(-78.74,1338.58) 38(-78.74,1417.32) 39(-157.48,0) 40(-157.48,78.74) 41(-157.48,157.48) 42(-157.48,236.22) 43(-157.48,314.96) 44(-157.48,393.7) 45(-157.48,472.44) 46(-157.48,551.18) 47(-157.48,629.92) 48(-157.48,708.66) 49(-157.48,787.4) 50(-157.48,866.14) 51(-157.48,944.88) 52(-157.48,1023.62) 53(-157.48,1102.36) 54(-157.48,1181.1) 55(-157.48,1259.84) 56(-157.48,1338.58) 57(-157.48,1417.32) 58(-236.22,0) 59(-236.22,78.74) 60(-236.22,157.48) 61(-236.22,236.22) 62(-236.22,314.96) 63(-236.22,393.7) 64(-236.22,472.44) 65(-236.22,551.18) 66(-236.22,629.92) 67(-236.22,708.66) 68(-236.22,787.4) 69(-236.22,866.14) 70(-236.22,944.88) 71(-236.22,1023.62) 72(-236.22,1102.36) 73(-236.22,1181.1) 74(-236.22,1259.84) 75(-236.22,1338.58) 76(-236.22,1417.32) 77(-314.96,0) 78(-314.96,78.74) 79(-314.96,157.48) 80(-314.96,236.22) 81(-314.96,314.96) 82(-314.96,393.7) 83(-314.96,472.44) 84(-314.96,551.18) 85(-314.96,629.92) 86(-314.96,708.66) 87(-314.96,787.4) 88(-314.96,866.14) 89(-314.96,944.88) 90(-314.96,1023.62) 91(-314.96,1102.36) 92(-314.96,1181.1) 93(-314.96,1259.84) 94(-314.96,1338.58) 95(-314.96,1417.32) 96(-393.7,0) 97(-393.7,157.48) 98(-393.7,314.96) 99(-393.7,472.44) 100(-393.7,629.92) 101(-393.7,787.4) 102(-393.7,944.88) 103(-393.7,1102.36) 104(-393.7,1259.84) 105(-393.7,1417.32)
Top Overlay:
  lines w10: -6.39,-39.37 229.83,-39.37 ccw(c229.83,0) 269.2,0 269.2,1437.01 ccw(c249.52,1437.01) 249.52,1456.69 -6.39,1456.69